# Altium footprint library PowerProducts.PCBLIB: 166 footprints (part 5 of 11)
Each footprint in its own frame and in the unit in brackets; x right, y up, seen from the top. Pads: shape width x height; smd on the part's side, far side on the other; paste and mask are expansions set on the pad; w line width, h text height; cw(c..) or ccw(c..) is an arc to the next point about the centre after c.
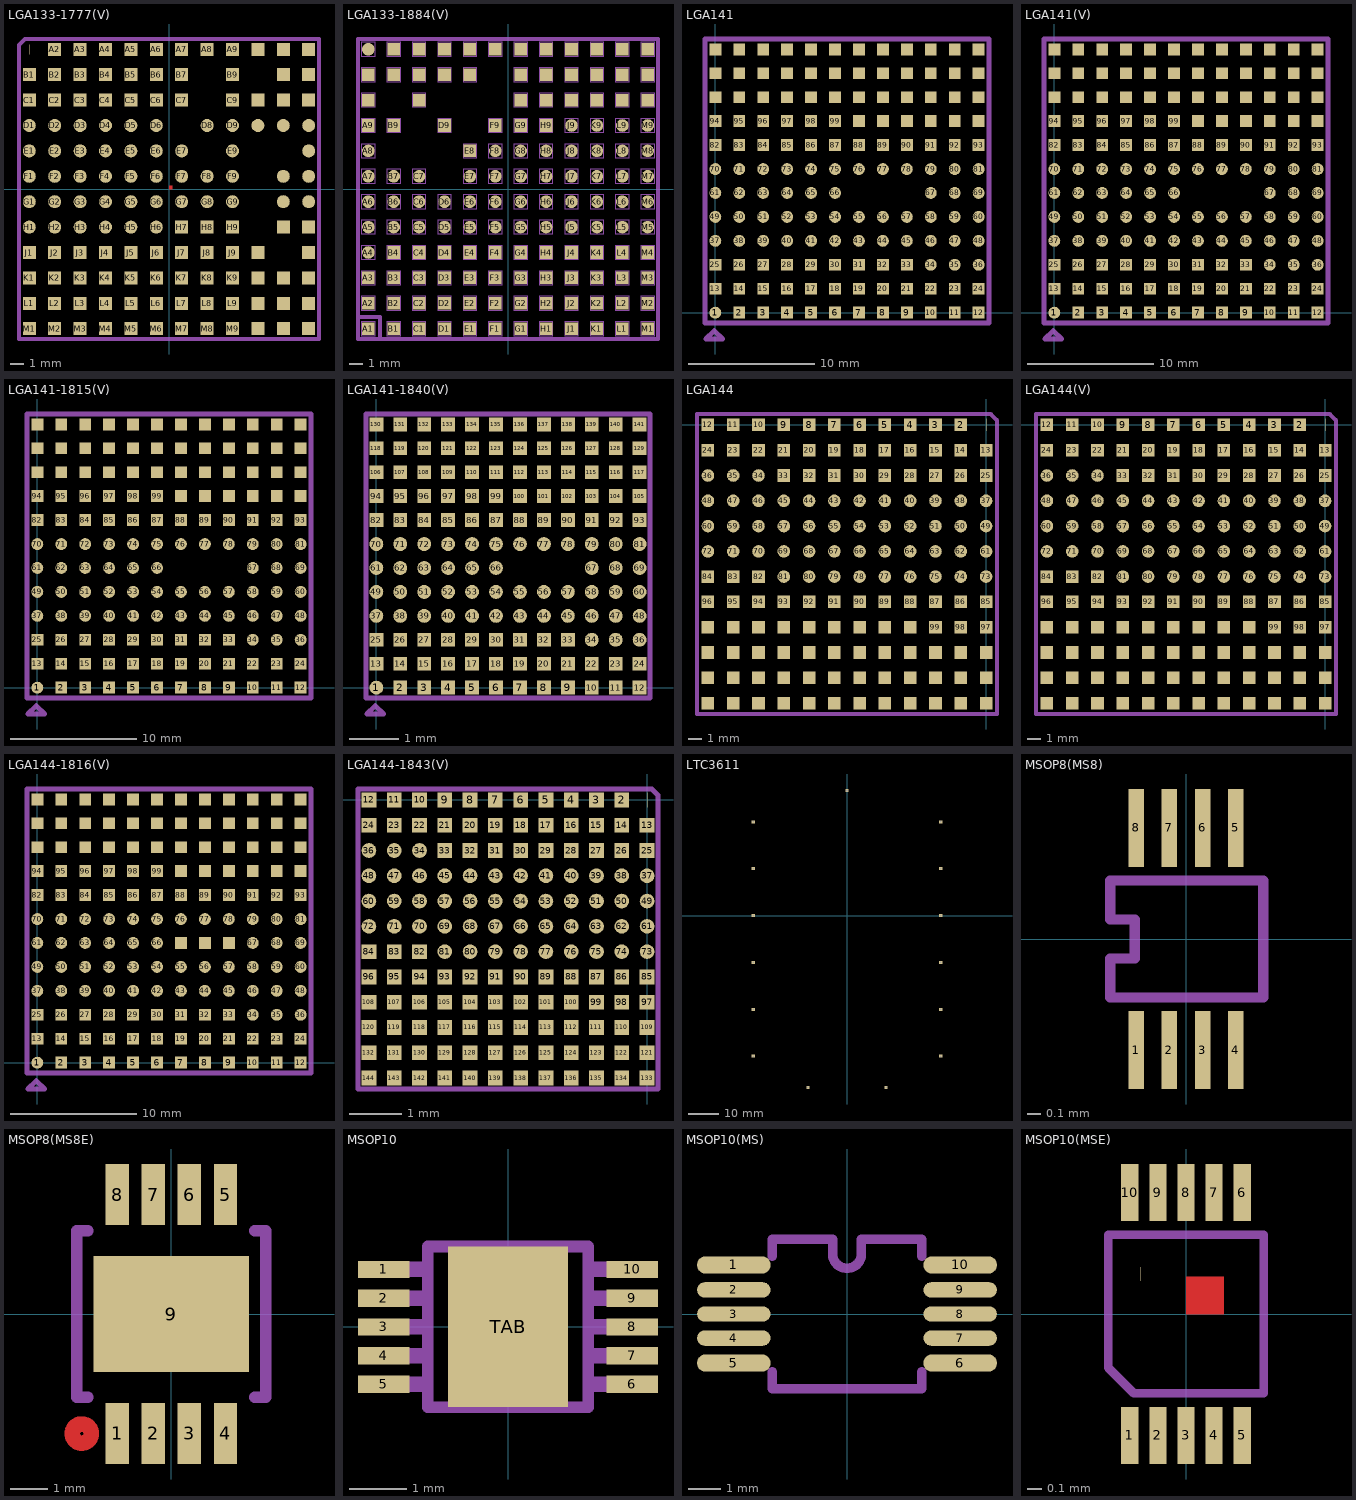
[diagram p4: the footprints below, top view; thin cyan lines are the x and y axes]

## LGA133-1777(V) [mil]
pads (133):
  rrect100% 0x29.53 smd: A1(-412.5,412.5)
  rect 38.39x38.39 smd: A2(-337.5,412.5) A3(-262.5,412.5) A4(-187.5,412.5) A5(-112.5,412.5) A6(-37.5,412.5) A7(37.5,412.5) A8(112.5,412.5) A9(187.5,412.5) A10(262.5,412.5) A11(337.5,412.5) A12(412.5,412.5) B1(-412.5,337.5) B2(-337.5,337.5) B3(-262.5,337.5) B4(-187.5,337.5) B5(-112.5,337.5) B6(-37.5,337.5) B7(37.5,337.5) B9(187.5,337.5) B11(337.5,337.5) B12(412.5,337.5) C1(-412.5,262.5) C2(-337.5,262.5) C3(-262.5,262.5) C4(-187.5,262.5) C5(-112.5,262.5) C6(-37.5,262.5) C7(37.5,262.5) C9(187.5,262.5) C10(262.5,262.5) C11(337.5,262.5) C12(412.5,262.5) H7(37.5,-112.5) H8(112.5,-112.5) H9(187.5,-112.5) H11(337.5,-112.5) H12(412.5,-112.5) J1(-412.5,-187.5) J2(-337.5,-187.5) J3(-262.5,-187.5) J4(-187.5,-187.5) J5(-112.5,-187.5) J6(-37.5,-187.5) J7(37.5,-187.5) J8(112.5,-187.5) J9(187.5,-187.5) J10(262.5,-187.5) J12(412.5,-187.5) K1(-412.5,-262.5) K2(-337.5,-262.5) K3(-262.5,-262.5) K4(-187.5,-262.5) K5(-112.5,-262.5) K6(-37.5,-262.5) K7(37.5,-262.5) K8(112.5,-262.5) K9(187.5,-262.5) K10(262.5,-262.5) K11(337.5,-262.5) K12(412.5,-262.5) L1(-412.5,-337.5) L2(-337.5,-337.5) L3(-262.5,-337.5) L4(-187.5,-337.5) L5(-112.5,-337.5) L6(-37.5,-337.5) L7(37.5,-337.5) L8(112.5,-337.5) L9(187.5,-337.5) L10(262.5,-337.5) L11(337.5,-337.5) L12(412.5,-337.5) M1(-412.5,-412.5) M2(-337.5,-412.5) M3(-262.5,-412.5) M4(-187.5,-412.5) M5(-112.5,-412.5) M6(-37.5,-412.5) M7(37.5,-412.5) M8(112.5,-412.5) M9(187.5,-412.5) M10(262.5,-412.5) M11(337.5,-412.5) M12(412.5,-412.5)
  rrect100% 38.39x38.39 smd: D1(-412.5,187.5) D2(-337.5,187.5) D3(-262.5,187.5) D4(-187.5,187.5) D5(-112.5,187.5) D6(-37.5,187.5) D8(112.5,187.5) D9(187.5,187.5) D10(262.5,187.5) D11(337.5,187.5) D12(412.5,187.5) E1(-412.5,112.5) E2(-337.5,112.5) E3(-262.5,112.5) E4(-187.5,112.5) E5(-112.5,112.5) E6(-37.5,112.5) E7(37.5,112.5) E9(187.5,112.5) E12(412.5,112.5) F1(-412.5,37.5) F2(-337.5,37.5) F3(-262.5,37.5) F4(-187.5,37.5) F5(-112.5,37.5) F6(-37.5,37.5) F7(37.5,37.5) F8(112.5,37.5) F9(187.5,37.5) F11(337.5,37.5) F12(412.5,37.5) G1(-412.5,-37.5) G2(-337.5,-37.5) G3(-262.5,-37.5) G4(-187.5,-37.5) G5(-112.5,-37.5) G6(-37.5,-37.5) G7(37.5,-37.5) G8(112.5,-37.5) G9(187.5,-37.5) G11(337.5,-37.5) G12(412.5,-37.5) H1(-412.5,-112.5) H2(-337.5,-112.5) H3(-262.5,-112.5) H4(-187.5,-112.5) H5(-112.5,-112.5) H6(-37.5,-112.5)
Top Layer:
  region: 0,0 10,0 10,10 0,10
Top Paste:
  region: 0,0 10,0 10,10 0,10
Top Solder:
  region: 0,0 10,0 10,10 0,10
Mechanical 2:
  lines w11.81: -442.91,-442.91 -442.91,425.2 -425.2,442.91 442.91,442.91 442.91,-442.91 -442.91,-442.91

## LGA133-1884(V) [mil]
pads (133):
  rect 37.2x37.2 smd: A1(-412.5,-412.5) A2(-412.5,-337.5) A3(-412.5,-262.5) A9(-412.5,187.5) A10(-412.5,262.5) A11(-412.5,337.5) B1(-337.5,-412.5) B2(-337.5,-337.5) B3(-337.5,-262.5) B4(-337.5,-187.5) B9(-337.5,187.5) B11(-337.5,337.5) B12(-337.5,412.5) C1(-262.5,-412.5) C2(-262.5,-337.5) C3(-262.5,-262.5) C4(-262.5,-187.5) C10(-262.5,262.5) C11(-262.5,337.5) C12(-262.5,412.5) D1(-187.5,-412.5) D2(-187.5,-337.5) D3(-187.5,-262.5) D4(-187.5,-187.5) D9(-187.5,187.5) D11(-187.5,337.5) D12(-187.5,412.5) E1(-112.5,-412.5) E2(-112.5,-337.5) E3(-112.5,-262.5) E4(-112.5,-187.5) E8(-112.5,112.5) E11(-112.5,337.5) E12(-112.5,412.5) F1(-37.5,-412.5) F2(-37.5,-337.5) F3(-37.5,-262.5) F4(-37.5,-187.5) F9(-37.5,187.5) F12(-37.5,412.5) G1(37.5,-412.5) G2(37.5,-337.5) G3(37.5,-262.5) G4(37.5,-187.5) G9(37.5,187.5) G10(37.5,262.5) G11(37.5,337.5) G12(37.5,412.5) H1(112.5,-412.5) H2(112.5,-337.5) H3(112.5,-262.5) H4(112.5,-187.5) H9(112.5,187.5) H10(112.5,262.5) H11(112.5,337.5) H12(112.5,412.5) J1(187.5,-412.5) J2(187.5,-337.5) J3(187.5,-262.5) J4(187.5,-187.5) J10(187.5,262.5) J11(187.5,337.5) J12(187.5,412.5) K1(262.5,-412.5) K2(262.5,-337.5) K3(262.5,-262.5) K4(262.5,-187.5) K10(262.5,262.5) K11(262.5,337.5) K12(262.5,412.5) L1(337.5,-412.5) L2(337.5,-337.5) L3(337.5,-262.5) L4(337.5,-187.5) L10(337.5,262.5) L11(337.5,337.5) L12(337.5,412.5) M1(412.5,-412.5) M2(412.5,-337.5) M3(412.5,-262.5) M4(412.5,-187.5) M10(412.5,262.5) M11(412.5,337.5) M12(412.5,412.5)
  rrect100% 37.2x37.2 smd: A4(-412.5,-187.5) A5(-412.5,-112.5) A6(-412.5,-37.5) A7(-412.5,37.5) A8(-412.5,112.5) A12(-412.5,412.5) B5(-337.5,-112.5) B6(-337.5,-37.5) B7(-337.5,37.5) C5(-262.5,-112.5) C6(-262.5,-37.5) C7(-262.5,37.5) D5(-187.5,-112.5) D6(-187.5,-37.5) E5(-112.5,-112.5) E6(-112.5,-37.5) E7(-112.5,37.5) F5(-37.5,-112.5) F6(-37.5,-37.5) F7(-37.5,37.5) F8(-37.5,112.5) G5(37.5,-112.5) G6(37.5,-37.5) G7(37.5,37.5) G8(37.5,112.5) H5(112.5,-112.5) H6(112.5,-37.5) H7(112.5,37.5) H8(112.5,112.5) J5(187.5,-112.5) J6(187.5,-37.5) J7(187.5,37.5) J8(187.5,112.5) J9(187.5,187.5) K5(262.5,-112.5) K6(262.5,-37.5) K7(262.5,37.5) K8(262.5,112.5) K9(262.5,187.5) L5(337.5,-112.5) L6(337.5,-37.5) L7(337.5,37.5) L8(337.5,112.5) L9(337.5,187.5) M5(412.5,-112.5) M6(412.5,-37.5) M7(412.5,37.5) M8(412.5,112.5) M9(412.5,187.5)
Mechanical 2:
  drawing of 540 lines, arcs and shapes, not listed

## LGA141 [mil]
pads (141):
  rrect100% 37.2x37.2 smd: 1(0,0) 34(675,150) 35(750,150) 36(825,150) 37(0,225) 38(75,225) 39(150,225) 40(225,225) 41(300,225) 42(375,225) 43(450,225) 44(525,225) 45(600,225) 46(675,225) 47(750,225) 48(825,225) 49(0,300) 50(75,300) 51(150,300) 52(225,300) 53(300,300) 54(375,300) 55(450,300) 56(525,300) 57(600,300) 58(675,300) 59(750,300) 60(825,300) 61(0,375) 62(75,375) 63(150,375) 64(225,375) 65(300,375) 66(375,375) 67(675,375) 68(750,375) 69(825,375) 70(0,450) 71(75,450) 72(150,450) 73(225,450) 74(300,450) 75(375,450) 76(450,450) 77(525,450) 78(600,450) 79(675,450) 80(750,450) 81(825,450)
  rect 37.2x37.2 smd: 2(75,0) 3(150,0) 4(225,0) 5(300,0) 6(375,0) 7(450,0) 8(525,0) 9(600,0) 10(675,0) 11(750,0) 12(825,0) 13(0,75) 14(75,75) 15(150,75) 16(225,75) 17(300,75) 18(375,75) 19(450,75) 20(525,75) 21(600,75) 22(675,75) 23(750,75) 24(825,75) 25(0,150) 26(75,150) 27(150,150) 28(225,150) 29(300,150) 30(375,150) 31(450,150) 32(525,150) 33(600,150) 82(0,525) 83(75,525) 84(150,525) 85(225,525) 86(300,525) 87(375,525) 88(450,525) 89(525,525) 90(600,525) 91(675,525) 92(750,525) 93(825,525) 94(0,600) 95(75,600) 96(150,600) 97(225,600) 98(300,600) 99(375,600) 100(450,600) 101(525,600) 102(600,600) 103(675,600) 104(750,600) 105(825,600) 106(0,675) 107(75,675) 108(150,675) 109(225,675) 110(300,675) 111(375,675) 112(450,675) 113(525,675) 114(600,675) 115(675,675) 116(750,675) 117(825,675) 118(0,750) 119(75,750) 120(150,750) 121(225,750) 122(300,750) 123(375,750) 124(450,750) 125(525,750) 126(600,750) 127(675,750) 128(750,750) 129(825,750) 130(0,825) 131(75,825) 132(150,825) 133(225,825) 134(300,825) 135(375,825) 136(450,825) 137(525,825) 138(600,825) 139(675,825) 140(750,825) 141(825,825)
Mechanical 2:
  lines w15: -32.48,-32.48 857.48,-32.48 857.48,857.48 -32.48,857.48 -32.48,-32.48 ; -30,-82.5 -3.75,-56.25 22.5,-82.5 -22.5,-82.5 -30,-82.5

## LGA141(V) [mil]
pads (141):
  rrect100% 37.2x37.2 smd: 1(0,0) 34(675,150) 35(750,150) 36(825,150) 37(0,225) 38(75,225) 39(150,225) 40(225,225) 41(300,225) 42(375,225) 43(450,225) 44(525,225) 45(600,225) 46(675,225) 47(750,225) 48(825,225) 49(0,300) 50(75,300) 51(150,300) 52(225,300) 53(300,300) 54(375,300) 55(450,300) 56(525,300) 57(600,300) 58(675,300) 59(750,300) 60(825,300) 61(0,375) 62(75,375) 63(150,375) 64(225,375) 65(300,375) 66(375,375) 67(675,375) 68(750,375) 69(825,375) 70(0,450) 71(75,450) 72(150,450) 73(225,450) 74(300,450) 75(375,450) 76(450,450) 77(525,450) 78(600,450) 79(675,450) 80(750,450) 81(825,450)
  rect 37.2x37.2 smd: 2(75,0) 3(150,0) 4(225,0) 5(300,0) 6(375,0) 7(450,0) 8(525,0) 9(600,0) 10(675,0) 11(750,0) 12(825,0) 13(0,75) 14(75,75) 15(150,75) 16(225,75) 17(300,75) 18(375,75) 19(450,75) 20(525,75) 21(600,75) 22(675,75) 23(750,75) 24(825,75) 25(0,150) 26(75,150) 27(150,150) 28(225,150) 29(300,150) 30(375,150) 31(450,150) 32(525,150) 33(600,150) 82(0,525) 83(75,525) 84(150,525) 85(225,525) 86(300,525) 87(375,525) 88(450,525) 89(525,525) 90(600,525) 91(675,525) 92(750,525) 93(825,525) 94(0,600) 95(75,600) 96(150,600) 97(225,600) 98(300,600) 99(375,600) 100(450,600) 101(525,600) 102(600,600) 103(675,600) 104(750,600) 105(825,600) 106(0,675) 107(75,675) 108(150,675) 109(225,675) 110(300,675) 111(375,675) 112(450,675) 113(525,675) 114(600,675) 115(675,675) 116(750,675) 117(825,675) 118(0,750) 119(75,750) 120(150,750) 121(225,750) 122(300,750) 123(375,750) 124(450,750) 125(525,750) 126(600,750) 127(675,750) 128(750,750) 129(825,750) 130(0,825) 131(75,825) 132(150,825) 133(225,825) 134(300,825) 135(375,825) 136(450,825) 137(525,825) 138(600,825) 139(675,825) 140(750,825) 141(825,825)
Mechanical 2:
  lines w15: -32.48,-32.48 857.48,-32.48 857.48,857.48 -32.48,857.48 -32.48,-32.48 ; -30,-82.5 22.5,-82.5 -3.75,-56.25 -30,-82.5

## LGA141-1815(V) [mil]
pads (141):
  rrect100% 37.2x37.2 smd: 1(0,0) 34(675,150) 35(750,150) 36(825,150) 37(0,225) 38(75,225) 39(150,225) 40(225,225) 41(300,225) 42(375,225) 43(450,225) 44(525,225) 45(600,225) 46(675,225) 47(750,225) 48(825,225) 49(0,300) 50(75,300) 51(150,300) 52(225,300) 53(300,300) 54(375,300) 55(450,300) 56(525,300) 57(600,300) 58(675,300) 59(750,300) 60(825,300) 61(0,375) 62(75,375) 63(150,375) 64(225,375) 65(300,375) 66(375,375) 67(675,375) 68(750,375) 69(825,375) 70(0,450) 71(75,450) 72(150,450) 73(225,450) 74(300,450) 75(375,450) 76(450,450) 77(525,450) 78(600,450) 79(675,450) 80(750,450) 81(825,450)
  rect 37.2x37.2 smd: 2(75,0) 3(150,0) 4(225,0) 5(300,0) 6(375,0) 7(450,0) 8(525,0) 9(600,0) 10(675,0) 11(750,0) 12(825,0) 13(0,75) 14(75,75) 15(150,75) 16(225,75) 17(300,75) 18(375,75) 19(450,75) 20(525,75) 21(600,75) 22(675,75) 23(750,75) 24(825,75) 25(0,150) 26(75,150) 27(150,150) 28(225,150) 29(300,150) 30(375,150) 31(450,150) 32(525,150) 33(600,150) 82(0,525) 83(75,525) 84(150,525) 85(225,525) 86(300,525) 87(375,525) 88(450,525) 89(525,525) 90(600,525) 91(675,525) 92(750,525) 93(825,525) 94(0,600) 95(75,600) 96(150,600) 97(225,600) 98(300,600) 99(375,600) 100(450,600) 101(525,600) 102(600,600) 103(675,600) 104(750,600) 105(825,600) 106(0,675) 107(75,675) 108(150,675) 109(225,675) 110(300,675) 111(375,675) 112(450,675) 113(525,675) 114(600,675) 115(675,675) 116(750,675) 117(825,675) 118(0,750) 119(75,750) 120(150,750) 121(225,750) 122(300,750) 123(375,750) 124(450,750) 125(525,750) 126(600,750) 127(675,750) 128(750,750) 129(825,750) 130(0,825) 131(75,825) 132(150,825) 133(225,825) 134(300,825) 135(375,825) 136(450,825) 137(525,825) 138(600,825) 139(675,825) 140(750,825) 141(825,825)
Mechanical 2:
  lines w15: -32.48,-32.48 857.48,-32.48 857.48,857.48 -32.48,857.48 -32.48,-32.48 ; -30,-82.5 22.5,-82.5 -3.75,-56.25 -30,-82.5

## LGA141-1840(V) [mil]
pads (141):
  rrect100% 11.05x11.05 smd: 1(0,0) 34(171.45,38.1) 35(190.5,38.1) 36(209.55,38.1) 37(0,57.15) 38(19.05,57.15) 39(38.1,57.15) 40(57.15,57.15) 41(76.2,57.15) 42(95.25,57.15) 43(114.3,57.15) 44(133.35,57.15) 45(152.4,57.15) 46(171.45,57.15) 47(190.5,57.15) 48(209.55,57.15) 49(0,76.2) 50(19.05,76.2) 51(38.1,76.2) 52(57.15,76.2) 53(76.2,76.2) 54(95.25,76.2) 55(114.3,76.2) 56(133.35,76.2) 57(152.4,76.2) 58(171.45,76.2) 59(190.5,76.2) 60(209.55,76.2) 61(0,95.25) 62(19.05,95.25) 63(38.1,95.25) 64(57.15,95.25) 65(76.2,95.25) 66(95.25,95.25) 67(171.45,95.25) 68(190.5,95.25) 69(209.55,95.25) 70(0,114.3) 71(19.05,114.3) 72(38.1,114.3) 73(57.15,114.3) 74(76.2,114.3) 75(95.25,114.3) 76(114.3,114.3) 77(133.35,114.3) 78(152.4,114.3) 79(171.45,114.3) 80(190.5,114.3) 81(209.55,114.3)
  rect 11.05x11.05 smd: 2(19.05,0) 3(38.1,0) 4(57.15,0) 5(76.2,0) 6(95.25,0) 7(114.3,0) 8(133.35,0) 9(152.4,0) 10(171.45,0) 11(190.5,0) 12(209.55,0) 13(0,19.05) 14(19.05,19.05) 15(38.1,19.05) 16(57.15,19.05) 17(76.2,19.05) 18(95.25,19.05) 19(114.3,19.05) 20(133.35,19.05) 21(152.4,19.05) 22(171.45,19.05) 23(190.5,19.05) 24(209.55,19.05) 25(0,38.1) 26(19.05,38.1) 27(38.1,38.1) 28(57.15,38.1) 29(76.2,38.1) 30(95.25,38.1) 31(114.3,38.1) 32(133.35,38.1) 33(152.4,38.1) 82(0,133.35) 83(19.05,133.35) 84(38.1,133.35) 85(57.15,133.35) 86(76.2,133.35) 87(95.25,133.35) 88(114.3,133.35) 89(133.35,133.35) 90(152.4,133.35) 91(171.45,133.35) 92(190.5,133.35) 93(209.55,133.35) 94(0,152.4) 95(19.05,152.4) 96(38.1,152.4) 97(57.15,152.4) 98(76.2,152.4) 99(95.25,152.4) 100(114.3,152.4) 101(133.35,152.4) 102(152.4,152.4) 103(171.45,152.4) 104(190.5,152.4) 105(209.55,152.4) 106(0,171.45) 107(19.05,171.45) 108(38.1,171.45) 109(57.15,171.45) 110(76.2,171.45) 111(95.25,171.45) 112(114.3,171.45) 113(133.35,171.45) 114(152.4,171.45) 115(171.45,171.45) 116(190.5,171.45) 117(209.55,171.45) 118(0,190.5) 119(19.05,190.5) 120(38.1,190.5) 121(57.15,190.5) 122(76.2,190.5) 123(95.25,190.5) 124(114.3,190.5) 125(133.35,190.5) 126(152.4,190.5) 127(171.45,190.5) 128(190.5,190.5) 129(209.55,190.5) 130(0,209.55) 131(19.05,209.55) 132(38.1,209.55) 133(57.15,209.55) 134(76.2,209.55) 135(95.25,209.55) 136(114.3,209.55) 137(133.35,209.55) 138(152.4,209.55) 139(171.45,209.55) 140(190.5,209.55) 141(209.55,209.55)
Mechanical 2:
  lines w3.81: -8.25,-8.25 217.8,-8.25 217.8,217.8 -8.25,217.8 -8.25,-8.25 ; -7.62,-20.96 5.72,-20.96 -0.95,-14.29 -7.62,-20.96

## LGA144 [mil]
pads (144):
  rrect100% 0x37.2 smd: 1(0,0)
  rect 37.2x37.2 smd: 2(-75,0) 3(-150,0) 4(-225,0) 5(-300,0) 6(-375,0) 7(-450,0) 8(-525,0) 9(-600,0) 10(-675,0) 11(-750,0) 12(-825,0) 13(0,-75) 14(-75,-75) 15(-150,-75) 16(-225,-75) 17(-300,-75) 18(-375,-75) 19(-450,-75) 20(-525,-75) 21(-600,-75) 22(-675,-75) 23(-750,-75) 24(-825,-75) 25(0,-150) 26(-75,-150) 27(-150,-150) 28(-225,-150) 29(-300,-150) 30(-375,-150) 31(-450,-150) 32(-525,-150) 33(-600,-150) 82(-675,-450) 83(-750,-450) 84(-825,-450) 85(0,-525) 86(-75,-525) 87(-150,-525) 88(-225,-525) 89(-300,-525) 90(-375,-525) 91(-450,-525) 92(-525,-525) 93(-600,-525) 94(-675,-525) 95(-750,-525) 96(-825,-525) 97(0,-600) 98(-75,-600) 99(-150,-600) 100(-225,-600) 101(-300,-600) 102(-375,-600) 103(-450,-600) 104(-525,-600) 105(-600,-600) 106(-675,-600) 107(-750,-600) 108(-825,-600) 109(0,-675) 110(-75,-675) 111(-150,-675) 112(-225,-675) 113(-300,-675) 114(-375,-675) 115(-450,-675) 116(-525,-675) 117(-600,-675) 118(-675,-675) 119(-750,-675) 120(-825,-675) 121(0,-750) 122(-75,-750) 123(-150,-750) 124(-225,-750) 125(-300,-750) 126(-375,-750) 127(-450,-750) 128(-525,-750) 129(-600,-750) 130(-675,-750) 131(-750,-750) 132(-825,-750) 133(0,-825) 134(-75,-825) 135(-150,-825) 136(-225,-825) 137(-300,-825) 138(-375,-825) 139(-450,-825) 140(-525,-825) 141(-600,-825) 142(-675,-825) 143(-750,-825) 144(-825,-825)
  rrect100% 37.2x37.2 smd: 34(-675,-150) 35(-750,-150) 36(-825,-150) 37(0,-225) 38(-75,-225) 39(-150,-225) 40(-225,-225) 41(-300,-225) 42(-375,-225) 43(-450,-225) 44(-525,-225) 45(-600,-225) 46(-675,-225) 47(-750,-225) 48(-825,-225) 49(0,-300) 50(-75,-300) 51(-150,-300) 52(-225,-300) 53(-300,-300) 54(-375,-300) 55(-450,-300) 56(-525,-300) 57(-600,-300) 58(-675,-300) 59(-750,-300) 60(-825,-300) 61(0,-375) 62(-75,-375) 63(-150,-375) 64(-225,-375) 65(-300,-375) 66(-375,-375) 67(-450,-375) 68(-525,-375) 69(-600,-375) 70(-675,-375) 71(-750,-375) 72(-825,-375) 73(0,-450) 74(-75,-450) 75(-150,-450) 76(-225,-450) 77(-300,-450) 78(-375,-450) 79(-450,-450) 80(-525,-450) 81(-600,-450)
Mechanical 2:
  lines w12: -857.48,-857.48 -857.48,32.48 13.88,32.48 32.48,13.88 32.48,-857.48 -857.48,-857.48

## LGA144(V) [mil]
pads (144):
  rrect100% 0x37.2 smd: 1(0,0)
  rect 37.2x37.2 smd: 2(-75,0) 3(-150,0) 4(-225,0) 5(-300,0) 6(-375,0) 7(-450,0) 8(-525,0) 9(-600,0) 10(-675,0) 11(-750,0) 12(-825,0) 13(0,-75) 14(-75,-75) 15(-150,-75) 16(-225,-75) 17(-300,-75) 18(-375,-75) 19(-450,-75) 20(-525,-75) 21(-600,-75) 22(-675,-75) 23(-750,-75) 24(-825,-75) 25(0,-150) 26(-75,-150) 27(-150,-150) 28(-225,-150) 29(-300,-150) 30(-375,-150) 31(-450,-150) 32(-525,-150) 33(-600,-150) 82(-675,-450) 83(-750,-450) 84(-825,-450) 85(0,-525) 86(-75,-525) 87(-150,-525) 88(-225,-525) 89(-300,-525) 90(-375,-525) 91(-450,-525) 92(-525,-525) 93(-600,-525) 94(-675,-525) 95(-750,-525) 96(-825,-525) 97(0,-600) 98(-75,-600) 99(-150,-600) 100(-225,-600) 101(-300,-600) 102(-375,-600) 103(-450,-600) 104(-525,-600) 105(-600,-600) 106(-675,-600) 107(-750,-600) 108(-825,-600) 109(0,-675) 110(-75,-675) 111(-150,-675) 112(-225,-675) 113(-300,-675) 114(-375,-675) 115(-450,-675) 116(-525,-675) 117(-600,-675) 118(-675,-675) 119(-750,-675) 120(-825,-675) 121(0,-750) 122(-75,-750) 123(-150,-750) 124(-225,-750) 125(-300,-750) 126(-375,-750) 127(-450,-750) 128(-525,-750) 129(-600,-750) 130(-675,-750) 131(-750,-750) 132(-825,-750) 133(0,-825) 134(-75,-825) 135(-150,-825) 136(-225,-825) 137(-300,-825) 138(-375,-825) 139(-450,-825) 140(-525,-825) 141(-600,-825) 142(-675,-825) 143(-750,-825) 144(-825,-825)
  rrect100% 37.2x37.2 smd: 34(-675,-150) 35(-750,-150) 36(-825,-150) 37(0,-225) 38(-75,-225) 39(-150,-225) 40(-225,-225) 41(-300,-225) 42(-375,-225) 43(-450,-225) 44(-525,-225) 45(-600,-225) 46(-675,-225) 47(-750,-225) 48(-825,-225) 49(0,-300) 50(-75,-300) 51(-150,-300) 52(-225,-300) 53(-300,-300) 54(-375,-300) 55(-450,-300) 56(-525,-300) 57(-600,-300) 58(-675,-300) 59(-750,-300) 60(-825,-300) 61(0,-375) 62(-75,-375) 63(-150,-375) 64(-225,-375) 65(-300,-375) 66(-375,-375) 67(-450,-375) 68(-525,-375) 69(-600,-375) 70(-675,-375) 71(-750,-375) 72(-825,-375) 73(0,-450) 74(-75,-450) 75(-150,-450) 76(-225,-450) 77(-300,-450) 78(-375,-450) 79(-450,-450) 80(-525,-450) 81(-600,-450)
Mechanical 2:
  lines w12: -857.48,-857.48 -857.48,32.48 13.88,32.48 32.48,13.88 32.48,-857.48 -857.48,-857.48

## LGA144-1816(V) [mil]
pads (144):
  rrect100% 37.2x37.2 smd: 1(0,0) 34(675,150) 35(750,150) 36(825,150) 37(0,225) 38(75,225) 39(150,225) 40(225,225) 41(300,225) 42(375,225) 43(450,225) 44(525,225) 45(600,225) 46(675,225) 47(750,225) 48(825,225) 49(0,300) 50(75,300) 51(150,300) 52(225,300) 53(300,300) 54(375,300) 55(450,300) 56(525,300) 57(600,300) 58(675,300) 59(750,300) 60(825,300) 61(0,375) 62(75,375) 63(150,375) 64(225,375) 65(300,375) 66(375,375) 67(675,375) 68(750,375) 69(825,375) 70(0,450) 71(75,450) 72(150,450) 73(225,450) 74(300,450) 75(375,450) 76(450,450) 77(525,450) 78(600,450) 79(675,450) 80(750,450) 81(825,450)
  rect 37.2x37.2 smd: 2(75,0) 3(150,0) 4(225,0) 5(300,0) 6(375,0) 7(450,0) 8(525,0) 9(600,0) 10(675,0) 11(750,0) 12(825,0) 13(0,75) 14(75,75) 15(150,75) 16(225,75) 17(300,75) 18(375,75) 19(450,75) 20(525,75) 21(600,75) 22(675,75) 23(750,75) 24(825,75) 25(0,150) 26(75,150) 27(150,150) 28(225,150) 29(300,150) 30(375,150) 31(450,150) 32(525,150) 33(600,150) 82(0,525) 83(75,525) 84(150,525) 85(225,525) 86(300,525) 87(375,525) 88(450,525) 89(525,525) 90(600,525) 91(675,525) 92(750,525) 93(825,525) 94(0,600) 95(75,600) 96(150,600) 97(225,600) 98(300,600) 99(375,600) 100(450,600) 101(525,600) 102(600,600) 103(675,600) 104(750,600) 105(825,600) 106(0,675) 107(75,675) 108(150,675) 109(225,675) 110(300,675) 111(375,675) 112(450,675) 113(525,675) 114(600,675) 115(675,675) 116(750,675) 117(825,675) 118(0,750) 119(75,750) 120(150,750) 121(225,750) 122(300,750) 123(375,750) 124(450,750) 125(525,750) 126(600,750) 127(675,750) 128(750,750) 129(825,750) 130(0,825) 131(75,825) 132(150,825) 133(225,825) 134(300,825) 135(375,825) 136(450,825) 137(525,825) 138(600,825) 139(675,825) 140(750,825) 141(825,825) 142(450,375) 143(525,375) 144(600,375)
Mechanical 2:
  lines w15: -32.48,-32.48 857.48,-32.48 857.48,857.48 -32.48,857.48 -32.48,-32.48 ; -30,-82.5 22.5,-82.5 -3.75,-56.25 -30,-82.5

## LGA144-1843(V) [mil]
pads (144):
  rrect100% 0x11.05 smd: 1(0,0)
  rect 11.05x11.05 smd: 2(-19.05,0) 3(-38.1,0) 4(-57.15,0) 5(-76.2,0) 6(-95.25,0) 7(-114.3,0) 8(-133.35,0) 9(-152.4,0) 10(-171.45,0) 11(-190.5,0) 12(-209.55,0) 13(0,-19.05) 14(-19.05,-19.05) 15(-38.1,-19.05) 16(-57.15,-19.05) 17(-76.2,-19.05) 18(-95.25,-19.05) 19(-114.3,-19.05) 20(-133.35,-19.05) 21(-152.4,-19.05) 22(-171.45,-19.05) 23(-190.5,-19.05) 24(-209.55,-19.05) 25(0,-38.1) 26(-19.05,-38.1) 27(-38.1,-38.1) 28(-57.15,-38.1) 29(-76.2,-38.1) 30(-95.25,-38.1) 31(-114.3,-38.1) 32(-133.35,-38.1) 33(-152.4,-38.1) 82(-171.45,-114.3) 83(-190.5,-114.3) 84(-209.55,-114.3) 85(0,-133.35) 86(-19.05,-133.35) 87(-38.1,-133.35) 88(-57.15,-133.35) 89(-76.2,-133.35) 90(-95.25,-133.35) 91(-114.3,-133.35) 92(-133.35,-133.35) 93(-152.4,-133.35) 94(-171.45,-133.35) 95(-190.5,-133.35) 96(-209.55,-133.35) 97(0,-152.4) 98(-19.05,-152.4) 99(-38.1,-152.4) 100(-57.15,-152.4) 101(-76.2,-152.4) 102(-95.25,-152.4) 103(-114.3,-152.4) 104(-133.35,-152.4) 105(-152.4,-152.4) 106(-171.45,-152.4) 107(-190.5,-152.4) 108(-209.55,-152.4) 109(0,-171.45) 110(-19.05,-171.45) 111(-38.1,-171.45) 112(-57.15,-171.45) 113(-76.2,-171.45) 114(-95.25,-171.45) 115(-114.3,-171.45) 116(-133.35,-171.45) 117(-152.4,-171.45) 118(-171.45,-171.45) 119(-190.5,-171.45) 120(-209.55,-171.45) 121(0,-190.5) 122(-19.05,-190.5) 123(-38.1,-190.5) 124(-57.15,-190.5) 125(-76.2,-190.5) 126(-95.25,-190.5) 127(-114.3,-190.5) 128(-133.35,-190.5) 129(-152.4,-190.5) 130(-171.45,-190.5) 131(-190.5,-190.5) 132(-209.55,-190.5) 133(0,-209.55) 134(-19.05,-209.55) 135(-38.1,-209.55) 136(-57.15,-209.55) 137(-76.2,-209.55) 138(-95.25,-209.55) 139(-114.3,-209.55) 140(-133.35,-209.55) 141(-152.4,-209.55) 142(-171.45,-209.55) 143(-190.5,-209.55) 144(-209.55,-209.55)
  rrect100% 11.05x11.05 smd: 34(-171.45,-38.1) 35(-190.5,-38.1) 36(-209.55,-38.1) 37(0,-57.15) 38(-19.05,-57.15) 39(-38.1,-57.15) 40(-57.15,-57.15) 41(-76.2,-57.15) 42(-95.25,-57.15) 43(-114.3,-57.15) 44(-133.35,-57.15) 45(-152.4,-57.15) 46(-171.45,-57.15) 47(-190.5,-57.15) 48(-209.55,-57.15) 49(0,-76.2) 50(-19.05,-76.2) 51(-38.1,-76.2) 52(-57.15,-76.2) 53(-76.2,-76.2) 54(-95.25,-76.2) 55(-114.3,-76.2) 56(-133.35,-76.2) 57(-152.4,-76.2) 58(-171.45,-76.2) 59(-190.5,-76.2) 60(-209.55,-76.2) 61(0,-95.25) 62(-19.05,-95.25) 63(-38.1,-95.25) 64(-57.15,-95.25) 65(-76.2,-95.25) 66(-95.25,-95.25) 67(-114.3,-95.25) 68(-133.35,-95.25) 69(-152.4,-95.25) 70(-171.45,-95.25) 71(-190.5,-95.25) 72(-209.55,-95.25) 73(0,-114.3) 74(-19.05,-114.3) 75(-38.1,-114.3) 76(-57.15,-114.3) 77(-76.2,-114.3) 78(-95.25,-114.3) 79(-114.3,-114.3) 80(-133.35,-114.3) 81(-152.4,-114.3)
Mechanical 2:
  lines w3.81: -217.8,-217.8 -217.8,8.25 3.53,8.25 8.25,3.53 8.25,-217.8 -217.8,-217.8

## LTC3611 [mm]
pads (15):
  rect 1x1 hole 0.5: G$1BOOST(30.48,0) G$1EXTVCC(-30.48,-45.72) G$1FB(30.48,-30.48) G$1FCB(-30.48,-30.48) G$1GND(-12.7,-55.88) G$1INTVCC(30.48,-15.24) G$1ION(-30.48,15.24) G$1ITH(30.48,-45.72) G$1PGND(12.7,-55.88) G$1PGOOD(0,40.64) G$1RUN/SS(-30.48,0) G$1SW(30.48,15.24) G$1VIN(30.48,30.48) G$1VON(-30.48,30.48) G$1VRNG(-30.48,-15.24)

## MSOP8(MS8) [mil]
pads (8):
  rect 4.57x22.86 smd: 1(-14.63,-32.58) 2(-4.88,-32.58) 3(4.88,-32.58) 4(14.63,-32.58) 5(14.63,32.58) 6(4.88,32.58) 7(-4.88,32.58) 8(-14.63,32.58)
Mechanical 2:
  lines w3.05: -22.25,-17.15 22.71,-17.15 22.71,17.15 -22.25,17.15 -22.25,5.72 -15.01,5.72 -15.01,-5.72 -22.25,-5.72 -22.25,-17.15

## MSOP8(MS8E) [mm]
pads (9):
  rect 0.63x1.65 smd: 1(-1.463,-3.225) 2(-0.487,-3.225) 3(0.487,-3.225) 4(1.463,-3.225) 5(1.463,3.225) 6(0.487,3.225) 7(-0.487,3.225) 8(-1.463,3.225)
  rect 4.191x3.124 smd: 9(0,0)
Top Layer:
  circle w0.42: c-2.418,-3.229 r0.258
Mechanical 2:
  lines w0.305: -2.25,-2.25 -2.55,-2.25 -2.55,2.25 -2.25,2.25 ; 2.25,-2.25 2.55,-2.25 2.55,2.25 2.25,2.25

## MSOP10 [mm]
pads (11):
  rect 0.9x0.3 smd: 1(-2.16,1) 2(-2.16,0.5) 3(-2.16,0) 4(-2.16,-0.5) 5(-2.16,-1) 6(2.16,-1) 7(2.16,-0.5) 8(2.16,0) 9(2.16,0.5) 10(2.16,1)
  rect 2.083x2.794 smd: TAB(0,0)
Mechanical 2:
  lines w0.203: -0.5,1.399 ccw(c0,1.399) 0.5,1.399 ; -1.399,-1.399 1.399,-1.399 1.399,1.399 -1.399,1.399 -1.399,-1.399
Mechanical 18:
  rectangle: -2.45,0.865 -1.5,1.135
  rectangle: -2.45,0.365 -1.5,0.635
  rectangle: -2.45,-0.135 -1.5,0.135
  rectangle: -2.45,-0.635 -1.5,-0.365
  rectangle: -2.45,-1.135 -1.5,-0.865
  rectangle: 1.5,-1.135 2.45,-0.865
  rectangle: 1.5,-0.635 2.45,-0.365
  rectangle: 1.5,-0.135 2.45,0.135
  rectangle: 1.5,0.365 2.45,0.635
  rectangle: 1.5,0.865 2.45,1.135

## MSOP10(MS) [mm]
pads (10):
  rrect100% 2.295x0.54 smd: 1(-3.529,1.53) 5(-3.529,-1.53) 6(3.529,-1.53) 10(3.529,1.53)
  rrect100% 2.295x0.48 smd: 2(-3.529,0.75) 3(-3.529,0) 4(-3.529,-0.75) 7(3.529,-0.75) 8(3.529,0) 9(3.529,0.75)
Mechanical 2:
  lines w0.3: -2.325,-1.8 -2.325,-2.325 2.325,-2.325 2.325,-1.8 ; -2.325,1.8 -2.325,2.325 -0.45,2.325 -0.45,1.875 ccw(c0,1.875) 0.45,1.875 0.45,2.325 2.325,2.325 2.325,1.8

## MSOP10(MSE) [mil]
pads (11):
  rect 4.57x15.24 smd: 1(-15.01,-32.38) 2(-7.51,-32.38) 3(0,-32.38) 4(7.51,-32.38) 5(15.01,-32.38) 6(15.01,32.38) 7(7.51,32.38) 8(0,32.38) 9(-7.51,32.38) 10(-15.01,32.38)
  rect 0x3.81 smd: 11(-12.19,10.67)
Top Layer:
  region: 0,0 10,0 10,10 0,10
  region: 0,0 10,0 10,10 0,10
  region: 0,0 10,0 10,10 0,10
  region: 0,0 10,0 10,10 0,10
  region: 0,0 10,0 10,10 0,10
Top Paste:
  region: 0,0 10,0 10,10 0,10
  region: 0,0 10,0 10,10 0,10
  region: 0,0 10,0 10,10 0,10
  region: 0,0 10,0 10,10 0,10
  region: 0,0 10,0 10,10 0,10
Top Solder:
  region: 0,0 10,0 10,10 0,10
  region: 0,0 10,0 10,10 0,10
  region: 0,0 10,0 10,10 0,10
  region: 0,0 10,0 10,10 0,10
  region: 0,0 10,0 10,10 0,10
Mechanical 2:
  lines w2.29: -20.73,-14.33 -13.91,-21.15 20.73,-21.15 20.73,21.15 -20.73,21.15 -20.73,-14.33